# Altium footprint library iMX6 TinyRex Baseboard Lite_V1I1_PCB.PcbLib: 58 footprints (part 3 of 4)
Each footprint in its own frame and in the unit in brackets; x right, y up, seen from the top. Pads: shape width x height; smd on the part's side, far side on the other; paste and mask are expansions set on the pad; w line width, h text height; cw(c..) or ccw(c..) is an arc to the next point about the centre after c.
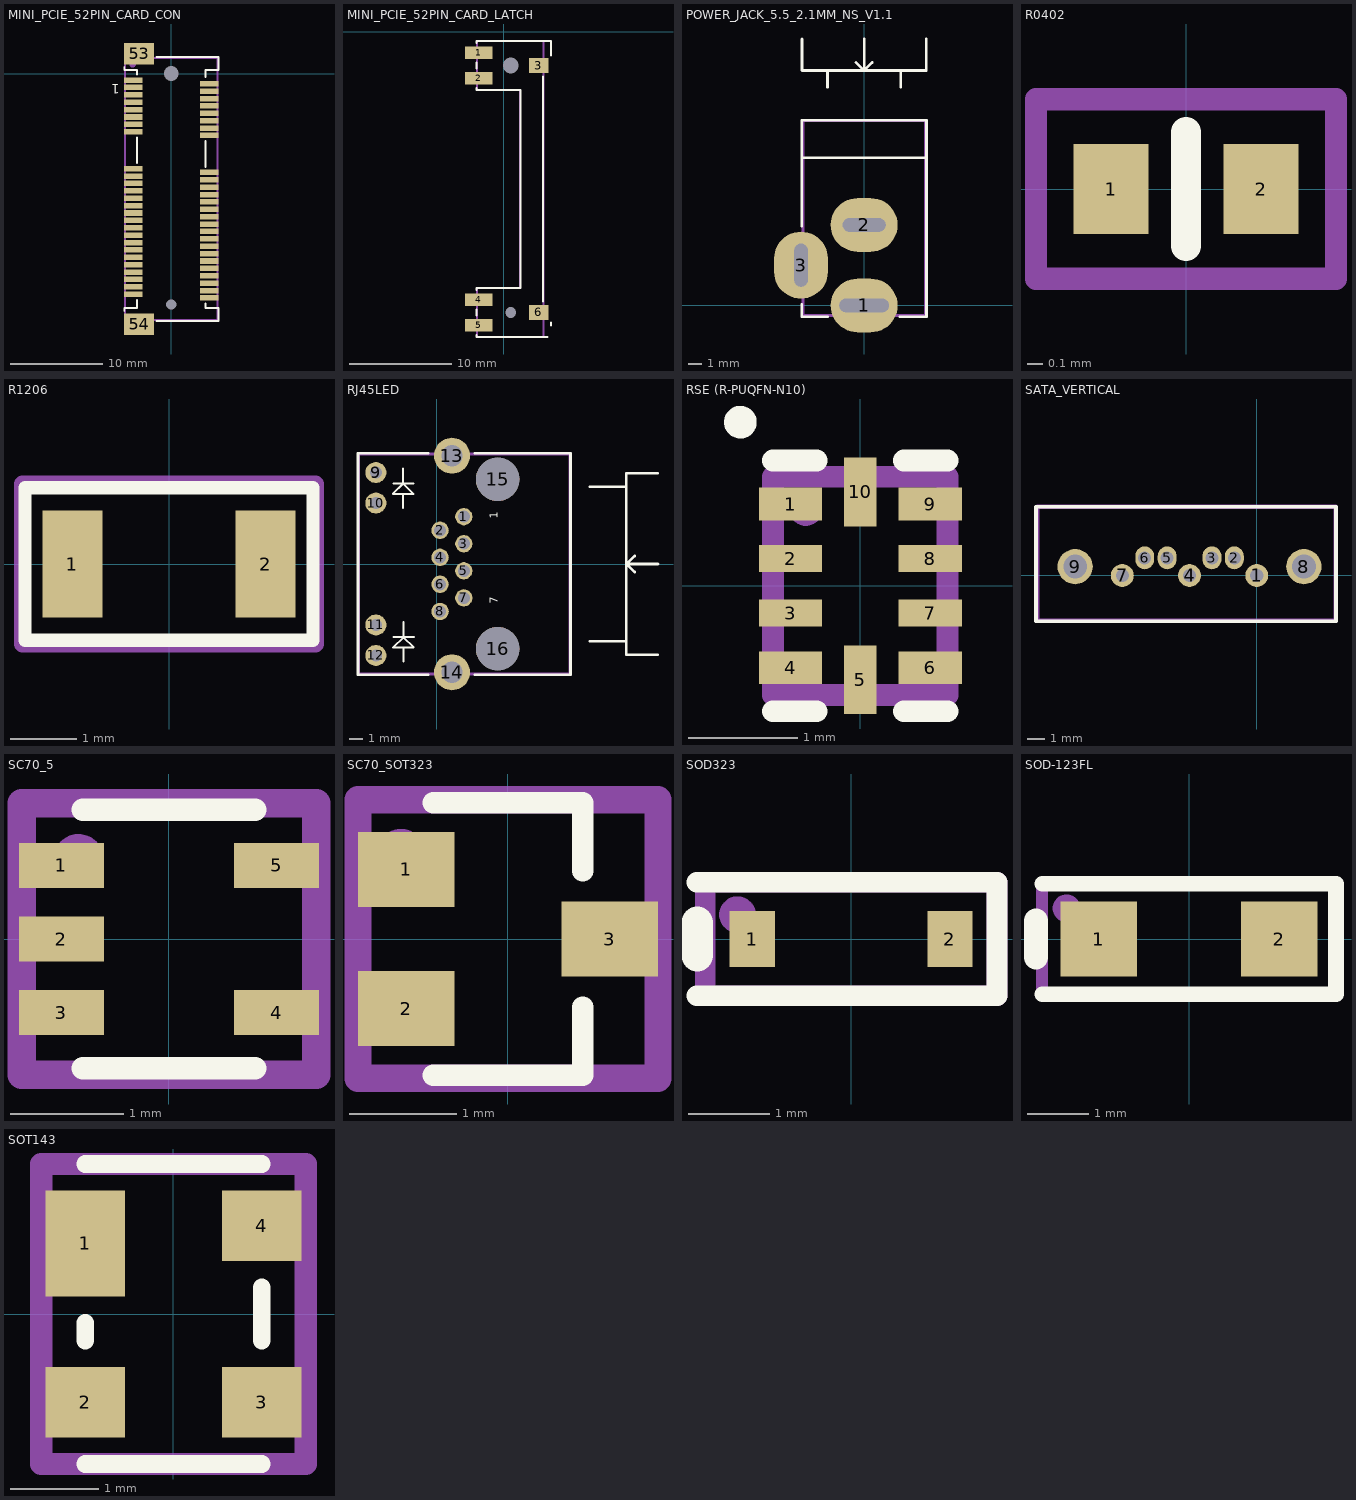
[diagram p2: the footprints below, top view; thin cyan lines are the x and y axes]

## MINI_PCIE_52PIN_CARD_CON [mm] "Creator MM"
height 5.9
pads (56):
  rect 2x0.6 smd mask+0.05: 1(-4.1,-0.7) 2(4.1,-1.1) 3(-4.1,-1.5) 4(4.1,-1.9) 5(-4.1,-2.3) 6(4.1,-2.7) 7(-4.1,-3.1) 8(4.1,-3.5) 9(-4.1,-3.9) 10(4.1,-4.3) 11(-4.1,-4.7) 12(4.1,-5.1) 13(-4.1,-5.5) 14(4.1,-5.9) 15(-4.1,-6.3) 16(4.1,-6.7) 17(-4.1,-10.3) 18(4.1,-10.7) 19(-4.1,-11.1) 20(4.1,-11.5) 21(-4.1,-11.9) 22(4.1,-12.3) 23(-4.1,-12.7) 24(4.1,-13.1) 25(-4.1,-13.5) 26(4.1,-13.9) 27(-4.1,-14.3) 28(4.1,-14.7) 29(-4.1,-15.1) 30(4.1,-15.5) 31(-4.1,-15.9) 32(4.1,-16.3) 33(-4.1,-16.7) 34(4.1,-17.1) 35(-4.1,-17.5) 36(4.1,-17.9) 37(-4.1,-18.3) 38(4.1,-18.7) 39(-4.1,-19.1) 40(4.1,-19.5) 41(-4.1,-19.9) 42(4.1,-20.3) 43(-4.1,-20.7) 44(4.1,-21.1) 45(-4.1,-21.5) 46(4.1,-21.9) 47(-4.1,-22.3) 48(4.1,-22.7) 49(-4.1,-23.1) 50(4.1,-23.5) 51(-4.1,-23.9) 52(4.1,-24.3)
  rect 3.2x2.3 smd: 53(-3.5,2.15) 54(-3.5,-27.15)
  rrect70% 0x0 hole 1.6 unplated: 55(0,0)
  rrect70% 0x0 hole 1.1 unplated: 56(0,-25)
Top Overlay:
  lines w0.2: -5.1,-25.7 -5.1,-25.4 -3.7,-25.4 -3.7,-24.5 ; -5.1,0.7 -5.1,0.4 -3.7,0.4 -3.7,-0.1 ; -3.7,-9.7 -3.7,-6.9 ; -1.6,-26.8 5.1,-26.8 5.1,-25.4 3.7,-25.4 3.7,-24.9 ; -1.6,1.8 5.1,1.8 5.1,0.4 3.7,0.4 3.7,-0.4 ; 3.7,-10.1 3.7,-7.3
  text "1" at -5.6,-1.15 h1.02
Mechanical 16:
  circle w0.5: c-4.2,1 r0.1
  lines w0.2: -5,-26.7 5,-26.7 5,1.7 -5,1.7 -5,-26.7
Mechanical 29:
  text ".Designator" at 1.9,-11.8 h1.52
3D body "K3D-MM60-52B1-E1-R2 JAE Connector Division Proprietary.STEP": height 5.95, standoff -0.75, extent -5,-27.35 5,2.35

## MINI_PCIE_52PIN_CARD_LATCH [mm] "Creator MM"
height 6.8
pads (8):
  rect 2.7x1.2 smd: 1(-2.45,-2.05) 2(-2.45,-4.55) 4(-2.45,-26.25) 5(-2.45,-28.75)
  rect 1.9x1.5 smd: 3(3.45,-3.3) 6(3.45,-27.5)
  rrect70% 0x0 hole 1.55: 7(0.7,-3.3)
  rrect70% 0x0 hole 1.05: 8(0.7,-27.5)
Top Overlay:
  lines w0.2: -2.65,-29.7 -2.65,-29.9 4.3,-29.9 ; -2.65,-27.8 -2.65,-27.2 ; -2.65,-25.3 -2.65,-25.1 1.65,-25.1 1.65,-5.7 -2.65,-5.7 -2.65,-5.5 ; -2.65,-3.6 -2.65,-3 ; -2.65,-1.1 -2.65,-0.9 4.65,-0.9 4.65,-2.3 ; 3.85,-26.4 3.85,-4.4 ; 4.65,-28.775 4.65,-28.5
Mechanical 16:
  lines w0.2: -2.6,-29.9 -2.6,-25.1 1.6,-25.1 1.6,-5.7 -2.6,-5.7 -2.6,-0.9 3.9,-0.9 3.9,-29.9 -2.6,-29.9
Mechanical 29:
  text ".Designator" at 2.2,-16.3 h1
3D body "K3D-MM60-EZH059-B5-R2 JAE Connector Division Proprietary.STEP": height 6.7, standoff -0.9, extent -3.25,-29.9 4.65,-0.9

## MINI_PCIE_FULL CARD [mm] ".Creator MM"
3D body "PCI Express Mini Card (Full-Mini Card).step": height 6.9, standoff 2.15, extent 0,0 50.95,30

## NUT A4 SS M2 [mm] "Creator MM"
3D body "Hexagon nut ISO 4032 (DIN 934) - M2.STEP": height 4.65, standoff 3.05, extent -2.31,-2 2.309,2

## POWER_JACK_5.5_2.1MM_NS_V1.1 [mm] "Creator MM. v1.1 - changed holes for slots"
pads (3):
  oval 5x4 hole 1 slot 3.7 at 0 deg: 1(0,0)
  oval 5x4 hole 1 slot 3.2 at 0 deg: 2(0,6)
  oval 4x5 hole 1 slot 3.2 at 90 deg: 3(-4.7,3)
Top Overlay:
  lines w0.2: -4.65,0.1 -4.65,-0.85 -2.7,-0.85 ; -4.65,5.9 -4.65,13.8 4.65,13.8 4.65,-0.85 2.65,-0.85 ; -4.65,11 4.65,11 ; -4.625,19.85 -4.625,17.5 4.625,17.5 4.625,19.85 ; -2.725,16.25 -2.725,17.5 ; -0.6,18.1 0,17.5 ; 0,19.85 0,17.5 ; 0.6,18.1 0,17.5 ; 2.725,16.25 2.725,17.5
Mechanical 16:
  lines w0.2: -4.55,-0.75 -4.55,13.75 4.55,13.75 4.55,-0.75 -4.55,-0.75
Mechanical 29:
  text ".Designator" at 0.7,4.4 h1.52
3D body "CUI-PJ-002AH.step": height 11.02, standoff -3.48, extent -4.9,-0.7 4.5,13.7

## R0402 [mm]
pads (2):
  rect 0.5x0.6 smd: 1(-0.5,0) 2(0.5,0)
Top Overlay:
  lines w0.2: 0,-0.381 0,0.381
Mechanical 16:
  lines w0.15: -1,-0.6 -1,0.6 1,0.6 1,-0.6 -1,-0.6
Mechanical 29:
  text ".Designator" at 0.7,0.2 h0.4
3D body "R0402.step": height 0.4, standoff 0, extent -0.5,-0.25 0.5,0.25

## R1206 [mm]
pads (2):
  rect 0.9x1.6 smd: 1(-1.45,0) 2(1.45,0)
Top Overlay:
  lines w0.2: -2.159,-1.143 2.159,-1.143 2.159,1.143 -2.159,1.143 -2.159,-1.143
Mechanical 16:
  lines w0.254: -2.2,-1.2 2.2,-1.2 2.2,1.2 -2.2,1.2 -2.2,-1.2
Mechanical 29:
  text ".Designator" at -1.8,-0.5 h1
3D body "R1206.step": height 0.84, standoff 0, extent -1.6,-0.8 1.6,0.8

## RJ45LED [mm]
pads (16):
  round 1.3 hole 0.9: 1(2.03,3.55) 2(0.25,2.53) 3(2.03,1.52) 4(0.25,0.5) 5(2.03,-0.51) 6(0.25,-1.52) 7(2.03,-2.54) 8(0.25,-3.56)
  round 1.575 hole 0.9: 9(-4.57,6.86) 10(-4.57,4.57) 11(-4.57,-4.57) 12(-4.57,-6.86)
  round 2.7 hole 1.6: 13(1.14,8.13) 14(1.14,-8.13)
  round 3.25 hole 3.25 unplated: 15(4.57,6.35) 16(4.57,-6.35)
Top Overlay:
  lines w0.15: -3.26,6.04 -1.74,6.04 ; -3.24,-5.48 -1.72,-5.48 ; -2.53,4.22 -2.53,5.26 ; -2.53,7.15 -2.53,6.03 -1.76,5.26 -3.29,5.26 -2.51,6.04 ; -2.51,-7.3 -2.51,-6.26 ; -2.51,-4.37 -2.51,-5.49 -1.74,-6.26 -3.27,-6.26 -2.49,-5.48
  lines w0.2: -0.66,-8.3 -5.91,-8.3 -5.91,8.3 -0.66,8.3 ; 2.86,-8.3 10.03,-8.3 10.03,8.3 2.86,8.3 ; 11.5,-5.8 14.23,-5.8 ; 11.5,5.8 14.23,5.8 ; 14.85,-0.6 14.25,0 ; 14.85,0.6 14.25,0 ; 16.58,-6.8 14.23,-6.8 14.23,6.8 16.58,6.8 ; 16.6,0 14.25,0
  text "1" at 4.58,3.4 h0.6
  text "7" at 4.58,-3 h0.6
Mechanical 16:
  lines w0.254: -5.87,-8.25 -5.87,8.25 10.03,8.25 10.03,-8.15 9.93,-8.25 -5.87,-8.25
Mechanical 29:
  text ".Designator" at -0.1,-0.8 h1.52
3D body "c-2-406549-1-r4-3d.stp": height 14.8, standoff -3.92, extent -5.9,-9.3 10.821,9.328

## RSE (R-PUQFN-N10) [mm] "Creator MM"
pads (10):
  rect 0.58x0.3 smd mask+0.03: 1(-0.64,0.75) 4(-0.64,-0.75) 6(0.64,-0.75) 9(0.64,0.75)
  rect 0.58x0.25 smd mask+0.03: 2(-0.64,0.25) 3(-0.64,-0.25) 7(0.64,-0.25) 8(0.64,0.25)
  rect 0.3x0.63 smd mask+0.03: 5(0,-0.86) 10(0,0.86)
Top Overlay:
  circle w0.15: c-1.1,1.5 r0.075
  lines w0.2: -0.8,-1.15 -0.4,-1.15 ; -0.8,1.15 -0.4,1.15 ; 0.4,-1.15 0.8,-1.15 ; 0.4,1.15 0.8,1.15
Mechanical 16:
  circle w0.15: c-0.5,0.7 r0.075
  lines w0.2: -0.8,-1 -0.8,1 0.8,1 0.8,-1 -0.8,-1
Mechanical 29:
  text ".Designator" at 0.4,-0.7 h0.6
3D body: height 0.6, standoff 0, extent -0.75,-1 0.75,1

## SATA_VERTICAL [mm]
pads (9):
  round 1.3 hole 0.74: 1(0,0) 4(-3.81,0) 7(-7.62,0)
  oval 1.07x1.3 hole 0.74: 2(-1.27,1) 3(-2.54,1) 5(-5.08,1) 6(-6.35,1)
  round 2 hole 1.35: 8(2.67,0.5) 9(-10.29,0.5)
Top Overlay:
  lines w0.2: -12.51,-2.6 4.49,-2.6 4.49,3.9 -12.51,3.9 -12.51,-2.6
Mechanical 16:
  lines w0.254: -12.43,-2.555 4.47,-2.555 4.47,3.895 -12.43,3.895 -12.43,-2.555
Mechanical 29:
  text ".Designator" at -5.5,-0.2 h1.52
3D body "471554001.stp": height 8.43, standoff -2.62, extent -12.43,-2.555 4.47,3.895

## SC70_5 [mm]
pads (5):
  rect 0.75x0.4 smd mask+0.025: 1(-0.95,0.65) 2(-0.95,0) 3(-0.95,-0.65) 4(0.95,-0.65) 5(0.95,0.65)
Top Overlay:
  lines w0.2: -0.762,-1.143 0.762,-1.143 ; -0.762,1.143 0.762,1.143
Mechanical 16:
  circle w0.254: c-0.8,0.7 r0.1
  lines w0.254: -1.3,-1.2 -1.3,1.2 1.3,1.2 1.3,-1.2 -1.3,-1.2
Mechanical 29:
  text ".Designator" at 0.7,0.2 h0.6
3D body: height 0.8, standoff 0, extent 0.762,0.445 1.206,0.826
3D body: height 0.8, standoff 0, extent 0.762,-0.826 1.206,-0.445
3D body: height 0.8, standoff 0, extent -1.206,-0.826 -0.762,-0.445
3D body: height 0.8, standoff 0, extent -1.206,-0.191 -0.762,0.191
3D body: height 0.8, standoff 0, extent -1.206,0.445 -0.762,0.826
3D body: height 1.1, standoff 0, extent -0.762,-1.143 0.762,1.143

## SC70_SOT323 [mm]
pads (3):
  rect 0.9x0.7 smd: 1(-0.95,0.65) 2(-0.95,-0.65) 3(0.95,0)
Top Overlay:
  lines w0.2: -0.699,-1.27 0.699,-1.27 0.699,-0.635 ; -0.699,1.27 0.699,1.27 0.699,0.635
Mechanical 16:
  circle w0.254: c-1,0.8 r0.1
  lines w0.254: -1.4,-1.3 -1.4,1.3 1.4,1.3 1.4,-1.3 -1.4,-1.3
Mechanical 29:
  text ".Designator" at -0.3,0.5 h0.6
3D body: height 0.75, standoff 0, extent 0.699,-0.318 1.27,0.381
3D body: height 0.75, standoff 0, extent -1.27,-1.016 -0.699,-0.318
3D body: height 0.75, standoff 0, extent -1.27,0.318 -0.699,1.016
3D body: height 1.1, standoff 0, extent -0.699,-1.27 0.699,1.27

## SCREW M2x8 [mm] "Creator MM"
3D body "Hexagon head screw ISO 4017 (DIN 933) - M2 × 8.step": height 6.4, standoff -3, extent -2.31,-2 2.309,2

## SOD323 [mil]
pads (2):
  rect 22x27 smd mask+3: 1(-48,0) 2(48,0)
Top Overlay:
  lines w10: -74.8,-27.56 70.87,-27.56 70.87,27.56 -74.8,27.56
  lines w15.75: -74.8,-7.87 -74.8,7.87
Mechanical 16:
  circle w10: c-55.12,11.81 r3.94
  lines w10: -70.87,-27.56 70.87,-27.56 70.87,27.56 -70.87,27.56 -70.87,-27.56
Mechanical 29:
  text ".Designator" at -7.87,-7.87 h15.75
3D body "SOD323.step": height 38.78, standoff -0.2, extent -49.21,-24.6 49.21,24.61

## SOD-123FL [mm] "Wider inside part of pads. Creator MM"
pads (2):
  rect 1.25x1.22 smd: 1(-1.475,0) 2(1.475,0)
Top Overlay:
  lines w0.254: -2.4,-0.9 2.4,-0.9 2.4,0.9 -2.4,0.9
  lines w0.4: -2.5,-0.3 -2.5,0.3
Mechanical 16:
  circle w0.254: c-2,0.5 r0.1
  lines w0.2: -2.4,-0.9 2.4,-0.9 2.4,0.9 -2.4,0.9 -2.4,-0.9
Mechanical 29:
  text ".Designator" at 0.75,0.35 h0.6
3D body "SOD-123FL CASE 498.step": height 0.95, standoff 0, extent -1.8,-0.825 1.8,0.825

## SOT143 [mm]
pads (4):
  rect 0.9x1.2 smd: 1(-1,0.8)
  rect 0.9x0.8 smd: 2(-1,-1) 3(1,-1) 4(1,1)
Top Overlay:
  lines w0.2: -1,-1.7 1,-1.7 ; -1,-0.3 -1,-0.1 ; -1,1.7 1,1.7 ; 1,-0.3 1,0.3
Mechanical 16:
  circle w0.254: c-1,1.1 r0.1
  lines w0.254: -1.5,-1.7 1.5,-1.7 1.5,1.7 -1.5,1.7 -1.5,-1.7
Mechanical 29:
  text ".Designator" at 0.3,-0.5 h0.6
3D body: height 1, standoff 0, extent -1,-1.7 1,1.7